# Altium footprint library USB Port.PcbLib: 17 footprints (part 2 of 2)
Each footprint in its own frame and in the unit in brackets; x right, y up, seen from the top. Pads: shape width x height; smd on the part's side, far side on the other; paste and mask are expansions set on the pad; w line width, h text height; cw(c..) or ccw(c..) is an arc to the next point about the centre after c.
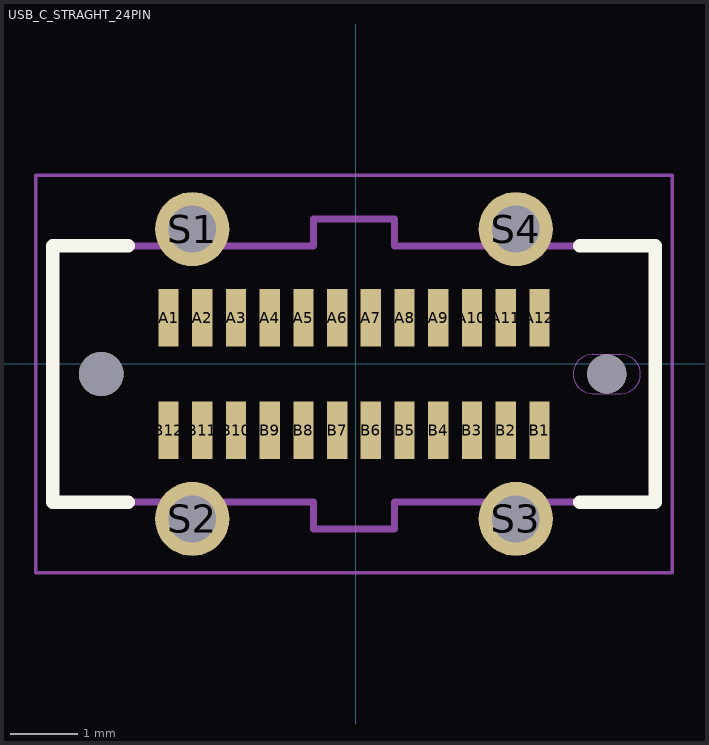
[diagram p1: the footprint, top view; thin cyan lines are the x and y axes]

## USB_C_STRAGHT_24PIN [mm]
pads (30):
  rect 0.3x0.85 smd: A1(-2.775,0.683) A2(-2.275,0.683) A3(-1.775,0.683) A4(-1.275,0.683) A5(-0.775,0.683) A6(-0.275,0.683) A7(0.225,0.683) A8(0.725,0.683) A9(1.225,0.683) A10(1.725,0.683) A11(2.225,0.683) A12(2.725,0.683) B1(2.725,-0.987) B2(2.225,-0.987) B3(1.725,-0.987) B4(1.225,-0.987) B5(0.725,-0.987) B6(0.225,-0.987) B7(-0.275,-0.987) B8(-0.775,-0.987) B9(-1.275,-0.987) B10(-1.775,-0.987) B11(-2.275,-0.987) B12(-2.775,-0.987)
  round 1.1 hole 0.7: S1(-2.425,1.998) S2(-2.425,-2.302) S3(2.375,-2.302) S4(2.375,1.998)
  round 0.66 hole 0.66 unplated: ""(-3.775,-0.152)
  round 0.58 hole 0.58 unplated: ""(3.725,-0.152)
Top Overlay:
  lines w0.2: -3.375,-2.052 -4.495,-2.052 -4.495,1.748 -3.375,1.748 ; 3.325,-2.052 4.445,-2.052 4.445,1.748 3.325,1.748
Mechanical 1:
  lines w0: 3.225,-0.152 cw(c3.515,-0.152) 3.515,0.138 3.935,0.138 cw(c3.935,-0.152) 4.225,-0.152 cw(c3.935,-0.152) 3.935,-0.442 3.515,-0.442 cw(c3.515,-0.152) 3.225,-0.152
Mechanical 13:
  lines w0.1: -4.495,-2.052 -0.625,-2.052 -0.625,-2.452 0.575,-2.452 0.575,-2.052 4.445,-2.052 4.445,1.748 0.575,1.748 0.575,2.148 -0.625,2.148 -0.625,1.748 -4.495,1.748 -4.495,-2.052
Mechanical 15:
  lines w0.05: -4.745,-3.102 -4.745,2.798 4.695,2.798 4.695,-3.102 -4.745,-3.102
3D body "step_temp.STEP": height 9.25, standoff -1.15, extent -4.495,-2.452 4.445,2.148